# Altium footprint library Kintex_SDR.PcbLib: 72 footprints (part 3 of 5)
Each footprint in its own frame and in the unit in brackets; x right, y up, seen from the top. Pads: shape width x height; smd on the part's side, far side on the other; paste and mask are expansions set on the pad; w line width, h text height; cw(c..) or ccw(c..) is an arc to the next point about the centre after c.
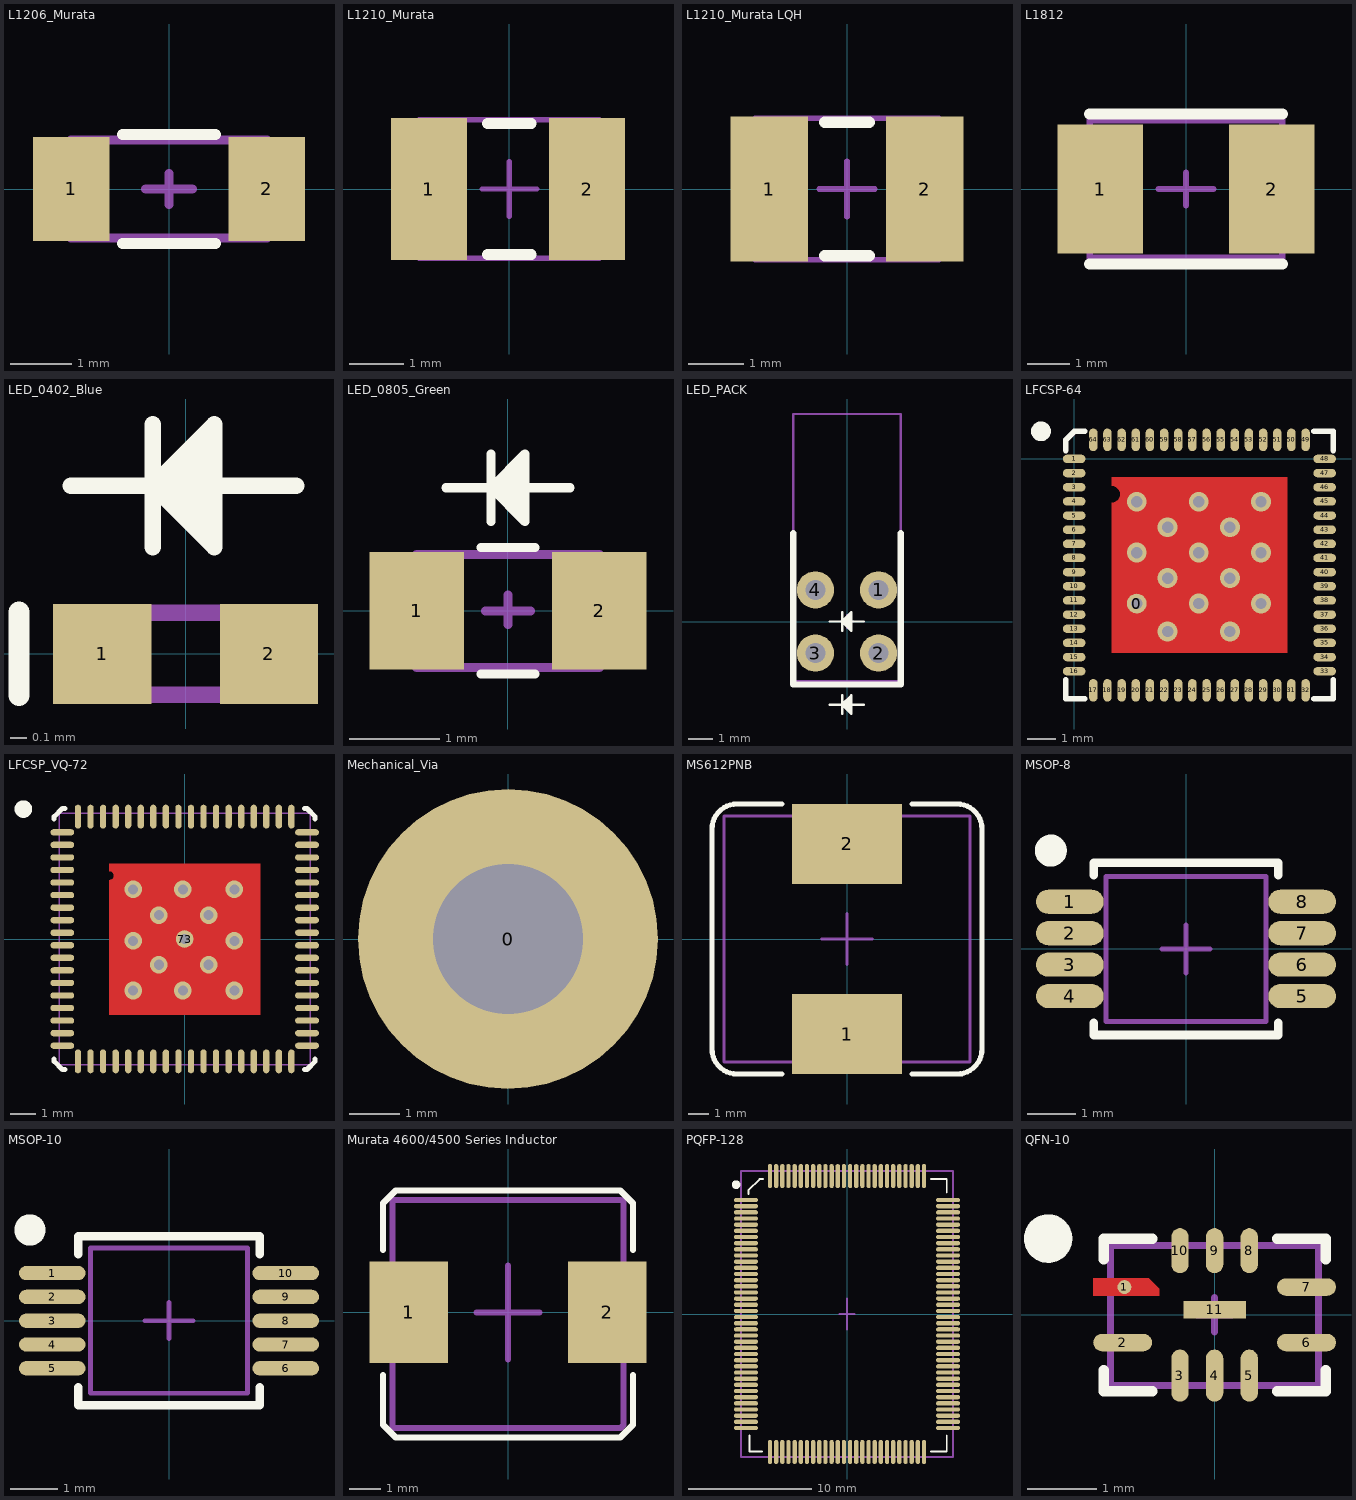
[diagram p2: the footprints below, top view; thin cyan lines are the x and y axes]

## L1206_Murata [mm]
height 0.5
pads (2):
  rect 1.25x1.7 smd: 1(-1.6,0) 2(1.6,0)
Top Overlay:
  lines w0.178: -0.762,-0.889 0.762,-0.889 ; -0.762,0.889 0.762,0.889
Mechanical 1:
  lines w0.15: -0.381,0 0.381,0 ; 0,-0.254 0,0.254 ; -1.6,-0.8 -1.6,0.8 1.6,0.8 1.6,-0.8 -1.6,-0.8
3D body "User Library-V1206HD.STEP": height 1.5, standoff 0, extent -1.6,-0.8 1.6,0.8

## L1210_Murata [mm]
height 1.3
pads (2):
  rect 1.4x2.6 smd: 1(-1.473,0) 2(1.422,0)
Top Overlay:
  lines w0.2: -0.4,-1.2 0.4,-1.2 ; -0.4,1.2 0.4,1.2
Mechanical 1:
  lines w0.1: -0.5,0 0.5,0 ; 0,-0.5 0,0.5 ; -1.651,-1.27 -1.651,1.27 1.651,1.27 1.651,-1.27 -1.651,-1.27
3D body "User Library-V1210HD.STEP": height 1.5, standoff 0, extent -1.6,-1.25 1.6,1.25

## L1210_Murata LQH [mm] "Power Lines Inductor"
height 1.3
pads (2):
  rect 1.4x2.6 smd: 1(-1.397,0) 2(1.397,0)
Top Overlay:
  lines w0.2: -0.4,-1.2 0.4,-1.2 ; -0.4,1.2 0.4,1.2
Mechanical 1:
  lines w0.1: -0.5,0 0.5,0 ; 0,-0.5 0,0.5 ; -1.651,-1.27 1.651,-1.27 1.651,1.27 -1.651,1.27 -1.651,-1.27
3D body "User Library-LQH32PN_sw.step": height 1.55, standoff 0, extent -1.6,-1.25 1.6,1.25

## L1812 [mm]
height 1
pads (2):
  rect 2x3 smd: 1(-2,0) 2(2,0)
Top Overlay:
  lines w0.254: -2.25,-1.75 2.25,-1.75 ; -2.25,1.75 2.25,1.75
Mechanical 1:
  lines w0.15: -0.635,0 0.635,0 ; 0,-0.381 0,0.381 ; -2.25,-1.6 -2.25,1.6 2.25,1.6 2.25,-1.6 -2.25,-1.6
3D body "User Library-Chip Inductor_1812.step": height 1.75, standoff 0, extent -2.25,-1.6 2.25,1.6

## LED_0402_Blue [mil]
height 12.6
pads (2):
  rect 23.62x24 smd: 1(-20,0) 2(20,0)
Top Overlay:
  region: 6.89,55.12 6.89,25.59 -7.87,40.35
  lines w3.94: -27.56,40.35 26.57,40.35 ; -7.87,25.59 -7.87,55.12 ; -7.87,40.35 6.89,55.12 6.89,25.59 -7.87,40.35 ; -7.87,40.35 -7.87,40.35
  lines w5: -40,-10 -40,10
Mechanical 1:
  lines w3.94: -19.87,-9.84 19.89,-9.84 19.89,9.85 -19.87,9.85 -19.87,-9.84
3D body "User Library-led_0402.step": height 17.72, standoff 0, extent -19.87,-9.84 19.89,9.85

## LED_0805_Green [mm]
height 1
pads (2):
  rect 1.05x1.3 smd: 1(-1.01,0) 2(1.01,0)
Top Overlay:
  region: 0.187,1.737 0.187,0.987 -0.188,1.362
  lines w0.1: -0.688,1.362 0.687,1.362 ; -0.3,-0.7 0.3,-0.7 ; -0.3,0.7 0.3,0.7 ; -0.188,0.987 -0.188,1.737 ; -0.188,1.362 0.187,0.987 0.187,1.737 -0.188,1.362 ; -0.188,1.362 -0.188,1.362
Mechanical 1:
  lines w0.1: -0.25,0 0.25,0 ; 0,-0.15 0,0.175 ; -1.01,-0.625 -1.01,0.625 1.01,0.625 1.01,-0.625 -1.01,-0.625
3D body "User Library-User Library-led_0805 GRE.step": height 1.1, standoff 0, extent -1.01,-0.625 1.01,0.625

## LED_PACK [mm]
height 10
pads (4):
  round 1.5 hole 0.8: 1(1.27,1.27) 2(1.27,-1.27) 3(-1.27,-1.27) 4(-1.27,1.27)
Top Overlay:
  region: 0.175,0.375 0.175,-0.375 -0.2,0
  region: 0.175,-2.975 0.175,-3.725 -0.2,-3.35
  lines w0.1: -0.7,-3.35 0.675,-3.35 ; -0.7,0 0.675,0 ; -0.2,-3.725 -0.2,-2.975 ; -0.2,-0.375 -0.2,0.375 ; -0.2,-3.35 0.175,-3.725 0.175,-2.975 -0.2,-3.35 ; -0.2,-3.35 -0.2,-3.35 ; -0.2,0 0.175,-0.375 0.175,0.375 -0.2,0 ; -0.2,0 -0.2,0
  lines w0.254: -2.159,3.556 -2.159,-2.54 2.159,-2.54 2.159,3.556
Mechanical 1:
  lines w0.1: -0.25,0 0.25,0 ; 0,-0.25 0,0.25 ; -2.16,-2.413 2.16,-2.413 2.16,8.357 -2.16,8.357 -2.16,-2.413
3D body "User Library-Lumex SSF-LXH240GGD.step": height 1.61, standoff -11.22, extent -2.16,-2.413 2.16,8.357

## LFCSP-64 [mm]
height 1
pads (65):
  round 0.7 hole 0.4: 0(2.211,-5.111)
  oval 0.8x0.3 smd: 1(0,0) 2(0,-0.5) 3(0,-1) 4(0,-1.5) 5(0,-2) 6(0,-2.5) 7(0,-3) 8(0,-3.5) 9(0,-4) 10(0,-4.5) 11(0,-5) 12(0,-5.5) 13(0,-6) 14(0,-6.5) 15(0,-7) 16(0,-7.5) 33(8.85,-7.5) 34(8.85,-7) 35(8.85,-6.5) 36(8.85,-6) 37(8.85,-5.5) 38(8.85,-5) 39(8.85,-4.5) 40(8.85,-4) 41(8.85,-3.5) 42(8.85,-3) 43(8.85,-2.5) 44(8.85,-2) 45(8.85,-1.5) 46(8.85,-1) 47(8.85,-0.5) 48(8.85,0)
  oval 0.3x0.8 smd: 17(0.675,-8.175) 18(1.175,-8.175) 19(1.675,-8.175) 20(2.175,-8.175) 21(2.675,-8.175) 22(3.175,-8.175) 23(3.675,-8.175) 24(4.175,-8.175) 25(4.675,-8.175) 26(5.175,-8.175) 27(5.675,-8.175) 28(6.175,-8.175) 29(6.675,-8.175) 30(7.175,-8.175) 31(7.675,-8.175) 32(8.175,-8.175) 49(8.175,0.675) 50(7.675,0.675) 51(7.175,0.675) 52(6.675,0.675) 53(6.175,0.675) 54(5.675,0.675) 55(5.175,0.675) 56(4.675,0.675) 57(4.175,0.675) 58(3.675,0.675) 59(3.175,0.675) 60(2.675,0.675) 61(2.175,0.675) 62(1.675,0.675) 63(1.175,0.675) 64(0.675,0.675)
via 3.3,-6.1 diameter 0.7 hole 0.4
via 5.5,-6.1 diameter 0.7 hole 0.4
via 2.211,-1.511 diameter 0.7 hole 0.4
via 2.211,-3.311 diameter 0.7 hole 0.4
via 6.6,-5.111 diameter 0.7 hole 0.4
via 4.4,-5.111 diameter 0.7 hole 0.4
via 5.5,-4.211 diameter 0.7 hole 0.4
via 3.3,-4.211 diameter 0.7 hole 0.4
via 6.6,-3.311 diameter 0.7 hole 0.4
via 4.4,-3.311 diameter 0.7 hole 0.4
via 5.5,-2.411 diameter 0.7 hole 0.4
via 3.3,-2.411 diameter 0.7 hole 0.4
via 6.6,-1.511 diameter 0.7 hole 0.4
via 4.4,-1.511 diameter 0.7 hole 0.4
Top Layer:
  region: 1.325,-6.85 1.325,-1.55 1.384,-1.544 1.492,-1.499 1.574,-1.417 1.619,-1.309 1.619,-1.191 1.574,-1.083 1.492,-1.001 1.384,-0.956 1.325,-0.95 1.325,-0.65 7.525,-0.65 7.525,-6.85
Top Overlay:
  circle w0.35: c-1.175,0.975 r0.175
  lines w0.2: -0.3,-7.8 -0.3,-8.475 0.375,-8.475 ; -0.3,0.3 -0.3,0.675 0,0.975 0.375,0.975 ; 8.475,-8.475 9.15,-8.475 9.15,-7.8 ; 8.475,0.975 9.15,0.975 9.15,0.3
Top Paste:
  rectangle: 1.7,-6.5 4.3,-3.9
  rectangle: 1.7,-3.6 4.3,-1
  rectangle: 4.6,-3.6 7.1,-1
  rectangle: 4.6,-6.5 7.1,-3.9
3D body "User Library-LFCSP-64 AD9984AKCPZ-170.step": height 0.82, standoff -0.05, extent -0.075,-8.25 8.925,0.75

## LFCSP_VQ-72 [mm] "QFN, 72-Leads, Body 10,00x10,00mm, Pitch 0,50mm, Thermal Pad 6,00x6,00mm, IPC Medium Density"
height 1
pads (73):
  oval 0.95x0.25 smd: 1(-4.875,4.25) 2(-4.875,3.75) 3(-4.875,3.25) 4(-4.875,2.75) 5(-4.875,2.25) 6(-4.875,1.75) 7(-4.875,1.25) 8(-4.875,0.75) 9(-4.875,0.25) 10(-4.875,-0.25) 11(-4.875,-0.75) 12(-4.875,-1.25) 13(-4.875,-1.75) 14(-4.875,-2.25) 15(-4.875,-2.75) 16(-4.875,-3.25) 17(-4.875,-3.75) 18(-4.875,-4.25) 37(4.875,-4.25) 38(4.875,-3.75) 39(4.875,-3.25) 40(4.875,-2.75) 41(4.875,-2.25) 42(4.875,-1.75) 43(4.875,-1.25) 44(4.875,-0.75) 45(4.875,-0.25) 46(4.875,0.25) 47(4.875,0.75) 48(4.875,1.25) 49(4.875,1.75) 50(4.875,2.25) 51(4.875,2.75) 52(4.875,3.25) 53(4.875,3.75) 54(4.875,4.25)
  oval 0.25x0.95 smd: 19(-4.25,-4.875) 20(-3.75,-4.875) 21(-3.25,-4.875) 22(-2.75,-4.875) 23(-2.25,-4.875) 24(-1.75,-4.875) 25(-1.25,-4.875) 26(-0.75,-4.875) 27(-0.25,-4.875) 28(0.25,-4.875) 29(0.75,-4.875) 30(1.25,-4.875) 31(1.75,-4.875) 32(2.25,-4.875) 33(2.75,-4.875) 34(3.25,-4.875) 35(3.75,-4.875) 36(4.25,-4.875) 55(4.25,4.875) 56(3.75,4.875) 57(3.25,4.875) 58(2.75,4.875) 59(2.25,4.875) 60(1.75,4.875) 61(1.25,4.875) 62(0.75,4.875) 63(0.25,4.875) 64(-0.25,4.875) 65(-0.75,4.875) 66(-1.25,4.875) 67(-1.75,4.875) 68(-2.25,4.875) 69(-2.75,4.875) 70(-3.25,4.875) 71(-3.75,4.875) 72(-4.25,4.875)
  round 0.7 hole 0.4: 73(0,0)
via 1.975,-2.05 diameter 0.7 hole 0.4
via -0.075,-2.05 diameter 0.7 hole 0.4
via -2.05,-2.05 diameter 0.7 hole 0.4
via 0.95,-1.025 diameter 0.7 hole 0.4
via -1.025,-1.025 diameter 0.7 hole 0.4
via 1.975,-0.075 diameter 0.7 hole 0.4
via -2.05,-0.075 diameter 0.7 hole 0.4
via 0.95,0.95 diameter 0.7 hole 0.4
via -1.025,0.95 diameter 0.7 hole 0.4
via 1.975,1.975 diameter 0.7 hole 0.4
via -0.075,1.975 diameter 0.7 hole 0.4
via -2.05,1.975 diameter 0.7 hole 0.4
Top Layer:
  region: -3,-3.025 -3,2.35 -2.966,2.353 -2.903,2.379 -2.854,2.428 -2.828,2.491 -2.828,2.559 -2.854,2.622 -2.903,2.671 -2.966,2.697 -3,2.7 -3,3 3,3 3,-3.025
Top Overlay:
  circle w0.35: c-6.425,5.175 r0.175
  lines w0.2: -5.2,-4.775 -5.2,-4.875 -4.875,-5.2 -4.775,-5.2 ; -5.2,4.775 -5.2,4.875 -4.875,5.2 -4.775,5.2 ; 4.775,-5.2 4.875,-5.2 5.2,-4.875 5.2,-4.775 ; 4.775,5.2 4.875,5.2 5.2,4.875 5.2,4.775
Top Paste:
  rectangle: 0.15,-2.75 2.65,-0.15
  rectangle: 0.15,0.15 2.65,2.75
  rectangle: -2.75,0.15 -0.15,2.75
  rectangle: -2.75,-2.75 -0.15,-0.15
Mechanical 1:
  lines w0.05: -5,-5 5,-5 5,5 -5,5 -5,-5
  lines w0.1: -0.5,0 0.5,0 ; 0,-0.5 0,0.5
3D body "User Library-LFCSP-72.STEP": height 1, standoff 0, extent -5.02,-5.02 5.02,5.02

## Mechanical_Via [mm] "Mechanical_Via"
pads (1):
  round 6 hole 3: 0(0,0)

## MS612PNB [mm]
height 8
pads (2):
  rect 5.5x4 smd: 1(0,-4.75) 2(0,4.75)
Top Overlay:
  lines w0.254: -3.25,-6.75 -5.5,-6.75 cw(c-5.5,-5.5) -6.75,-5.5 -6.75,5.5 cw(c-5.5,5.5) -5.5,6.75 -3.25,6.75 ; 3.25,-6.75 5.75,-6.75 ; 3.25,6.75 5.5,6.75 cw(c5.5,5.5) 6.75,5.5 6.75,-5.5 cw(c5.5,-5.5) 5.5,-6.75
Mechanical 1:
  lines w0.15: -1.27,0 1.27,0 ; 0,-1.27 0,1.27 ; -6.15,-6.15 -6.15,6.15 6.15,6.15 6.15,-6.15 -6.15,-6.15
3D body "Coilcraft-MS612PNB.step": height 8.22, standoff -0.04, extent -6.15,-6.15 6.15,6.15

## MSOP-8 [mm] "MSOP, 8-Leads"
height 1.1
pads (8):
  oval 1.4x0.5 smd: 1(-2.4,0.975) 2(-2.4,0.325) 3(-2.4,-0.325) 4(-2.4,-0.975) 5(2.4,-0.975) 6(2.4,-0.325) 7(2.4,0.325) 8(2.4,0.975)
Top Overlay:
  circle w0.35: c-2.794,2.032 r0.156
  lines w0.178: -1.905,-1.524 -1.905,-1.778 1.905,-1.778 1.905,-1.524 ; -1.905,1.524 -1.905,1.778 1.905,1.778 1.905,1.524
Mechanical 1:
  lines w0.1: -0.5,0 0.5,0 ; 0,-0.5 0,0.5 ; -1.651,-1.5 -1.651,1.5 1.651,1.5 1.651,-1.5 -1.651,-1.5
3D body "User Library-MSOP8-2.step": height 1.01, standoff 0, extent -2.575,-1.6 2.575,1.6

## MSOP-10 [mm] "MSOP, 10-Leads"
height 1.1
pads (10):
  oval 1.4x0.3 smd: 1(-2.45,1) 2(-2.45,0.5) 3(-2.45,0) 4(-2.45,-0.5) 5(-2.45,-1) 6(2.45,-1) 7(2.45,-0.5) 8(2.45,0) 9(2.45,0.5) 10(2.45,1)
Top Overlay:
  circle w0.35: c-2.921,1.905 r0.154
  lines w0.178: -1.905,-1.397 -1.905,-1.778 1.905,-1.778 1.905,-1.397 ; -1.905,1.397 -1.905,1.778 1.905,1.778 1.905,1.397
Mechanical 1:
  lines w0.1: -0.508,0 0.508,0 ; 0,-0.381 0,0.381 ; -1.651,-1.524 -1.651,1.524 1.651,1.524 1.651,-1.524 -1.651,-1.524
3D body "User Library-MSOP10-1.step": height 1.09, standoff 0, extent -2.575,-1.6 2.575,1.6

## Murata 4600/4500 Series Inductor [mm]
height 4
pads (2):
  rect 2.5x3.25 smd: 1(-3.175,0) 2(3.175,0)
Top Overlay:
  lines w0.2: -4,-2 -4,-3.6 -3.6,-4 3.6,-4 4,-3.6 4,-2 ; -4,2 -4,3.5 -3.6,3.9 3.6,3.9 4,3.5 4,2
Mechanical 1:
  lines w0.2: -1,0 1,0 ; 0,-1.5 0,1.5 ; 3.6,3.6 -3.7,3.6 -3.7,-3.7 3.6,-3.7 3.7,-3.6 3.7,3.6
3D body "User Library-Murata_4600.step": height 4.55, standoff 0, extent -3.714,-3.7 3.714,3.6

## PQFP-128 [mm] "PQFP, 128-Leads, Body 14,00x20,00mm, Pitch 0,50mm, IPC Medium Density"
height 3.15
pads (128):
  oval 1.95x0.35 smd: 1(-8.2,9.25) 2(-8.2,8.75) 3(-8.2,8.25) 4(-8.2,7.75) 5(-8.2,7.25) 6(-8.2,6.75) 7(-8.2,6.25) 8(-8.2,5.75) 9(-8.2,5.25) 10(-8.2,4.75) 11(-8.2,4.25) 12(-8.2,3.75) 13(-8.2,3.25) 14(-8.2,2.75) 15(-8.2,2.25) 16(-8.2,1.75) 17(-8.2,1.25) 18(-8.2,0.75) 19(-8.2,0.25) 20(-8.2,-0.25) 21(-8.2,-0.75) 22(-8.2,-1.25) 23(-8.2,-1.75) 24(-8.2,-2.25) 25(-8.2,-2.75) 26(-8.2,-3.25) 27(-8.2,-3.75) 28(-8.2,-4.25) 29(-8.2,-4.75) 30(-8.2,-5.25) 31(-8.2,-5.75) 32(-8.2,-6.25) 33(-8.2,-6.75) 34(-8.2,-7.25) 35(-8.2,-7.75) 36(-8.2,-8.25) 37(-8.2,-8.75) 38(-8.2,-9.25) 65(8.2,-9.25) 66(8.2,-8.75) 67(8.2,-8.25) 68(8.2,-7.75) 69(8.2,-7.25) 70(8.2,-6.75) 71(8.2,-6.25) 72(8.2,-5.75) 73(8.2,-5.25) 74(8.2,-4.75) 75(8.2,-4.25) 76(8.2,-3.75) 77(8.2,-3.25) 78(8.2,-2.75) 79(8.2,-2.25) 80(8.2,-1.75) 81(8.2,-1.25) 82(8.2,-0.75) 83(8.2,-0.25) 84(8.2,0.25) 85(8.2,0.75) 86(8.2,1.25) 87(8.2,1.75) 88(8.2,2.25) 89(8.2,2.75) 90(8.2,3.25) 91(8.2,3.75) 92(8.2,4.25) 93(8.2,4.75) 94(8.2,5.25) 95(8.2,5.75) 96(8.2,6.25) 97(8.2,6.75) 98(8.2,7.25) 99(8.2,7.75) 100(8.2,8.25) 101(8.2,8.75) 102(8.2,9.25)
  oval 0.35x1.95 smd: 39(-6.25,-11.2) 40(-5.75,-11.2) 41(-5.25,-11.2) 42(-4.75,-11.2) 43(-4.25,-11.2) 44(-3.75,-11.2) 45(-3.25,-11.2) 46(-2.75,-11.2) 47(-2.25,-11.2) 48(-1.75,-11.2) 49(-1.25,-11.2) 50(-0.75,-11.2) 51(-0.25,-11.2) 52(0.25,-11.2) 53(0.75,-11.2) 54(1.25,-11.2) 55(1.75,-11.2) 56(2.25,-11.2) 57(2.75,-11.2) 58(3.25,-11.2) 59(3.75,-11.2) 60(4.25,-11.2) 61(4.75,-11.2) 62(5.25,-11.2) 63(5.75,-11.2) 64(6.25,-11.2) 103(6.25,11.2) 104(5.75,11.2) 105(5.25,11.2) 106(4.75,11.2) 107(4.25,11.2) 108(3.75,11.2) 109(3.25,11.2) 110(2.75,11.2) 111(2.25,11.2) 112(1.75,11.2) 113(1.25,11.2) 114(0.75,11.2) 115(0.25,11.2) 116(-0.25,11.2) 117(-0.75,11.2) 118(-1.25,11.2) 119(-1.75,11.2) 120(-2.25,11.2) 121(-2.75,11.2) 122(-3.25,11.2) 123(-3.75,11.2) 124(-4.25,11.2) 125(-4.75,11.2) 126(-5.25,11.2) 127(-5.75,11.2) 128(-6.25,11.2)
Top Overlay:
  circle w0.35: c-9,10.5 r0.175
  lines w0.15: -8,9.75 -8,10.05 -7.1,10.95 -6.8,10.95 ; -7.9,-9.85 -7.9,-11.15 -6.9,-11.15 ; 6.8,-11.15 8.1,-11.15 8.1,-9.85 ; 6.8,10.95 8.1,10.95 8.1,9.85
Mechanical 1:
  lines w0.15: -0.635,0 0.635,0 ; 0,-1.27 0,1.27 ; -8.59,-11.597 8.612,-11.597 8.612,11.605 -8.59,11.605 -8.59,-11.597
3D body "SW3dPS-PQFP128.STEP": height 2.87, standoff -0.01, extent -8.59,-11.597 8.612,11.605

## QFN-10 [mm] "QFN-10 2x3 mm"
height 0.8
pads (11):
  round 0.2 smd: 1(-1.3,0.4)
  oval 0.85x0.25 smd: 2(-1.325,-0.4) 6(1.325,-0.4) 7(1.325,0.4)
  oval 0.25x0.75 smd: 3(-0.5,-0.875) 4(0,-0.875) 5(0.5,-0.875)
  oval 0.25x0.65 smd: 8(0.5,0.925) 9(0,0.925) 10(-0.5,0.925)
  rect 0.9x0.25 smd: 11(0,0.075)
Top Layer:
  region: -1.75,0.525 -0.95,0.525 -0.8,0.375 -0.8,0.275 -1.75,0.275
Top Overlay:
  circle w0.35: c-2.4,1.1 r0.175
  lines w0.15: -1.6,-0.8 -1.6,-1.1 -0.9,-1.1 ; -1.6,0.8 -1.6,1.1 -0.9,1.1 ; 0.9,-1.1 1.6,-1.1 1.6,-0.8 ; 0.9,1.1 1.6,1.1 1.6,0.8
Mechanical 1:
  lines w0.1: -0.25,0 0.25,0 ; 0,-0.25 0,0.25 ; -1.5,-1.02 -1.5,1 1.5,1 1.5,-1.02 -1.5,-1.02
3D body "User Library-DFN10.step": height 0.8, standoff 0, extent -1.5,-1.02 1.5,1